# Altium footprint library Tomra_Cadstar_Footprints.PcbLib: 373 footprints (part 17 of 24)
Each footprint in its own frame and in the unit in brackets; x right, y up, seen from the top. Pads: shape width x height; smd on the part's side, far side on the other; paste and mask are expansions set on the pad; w line width, h text height; cw(c..) or ccw(c..) is an arc to the next point about the centre after c.
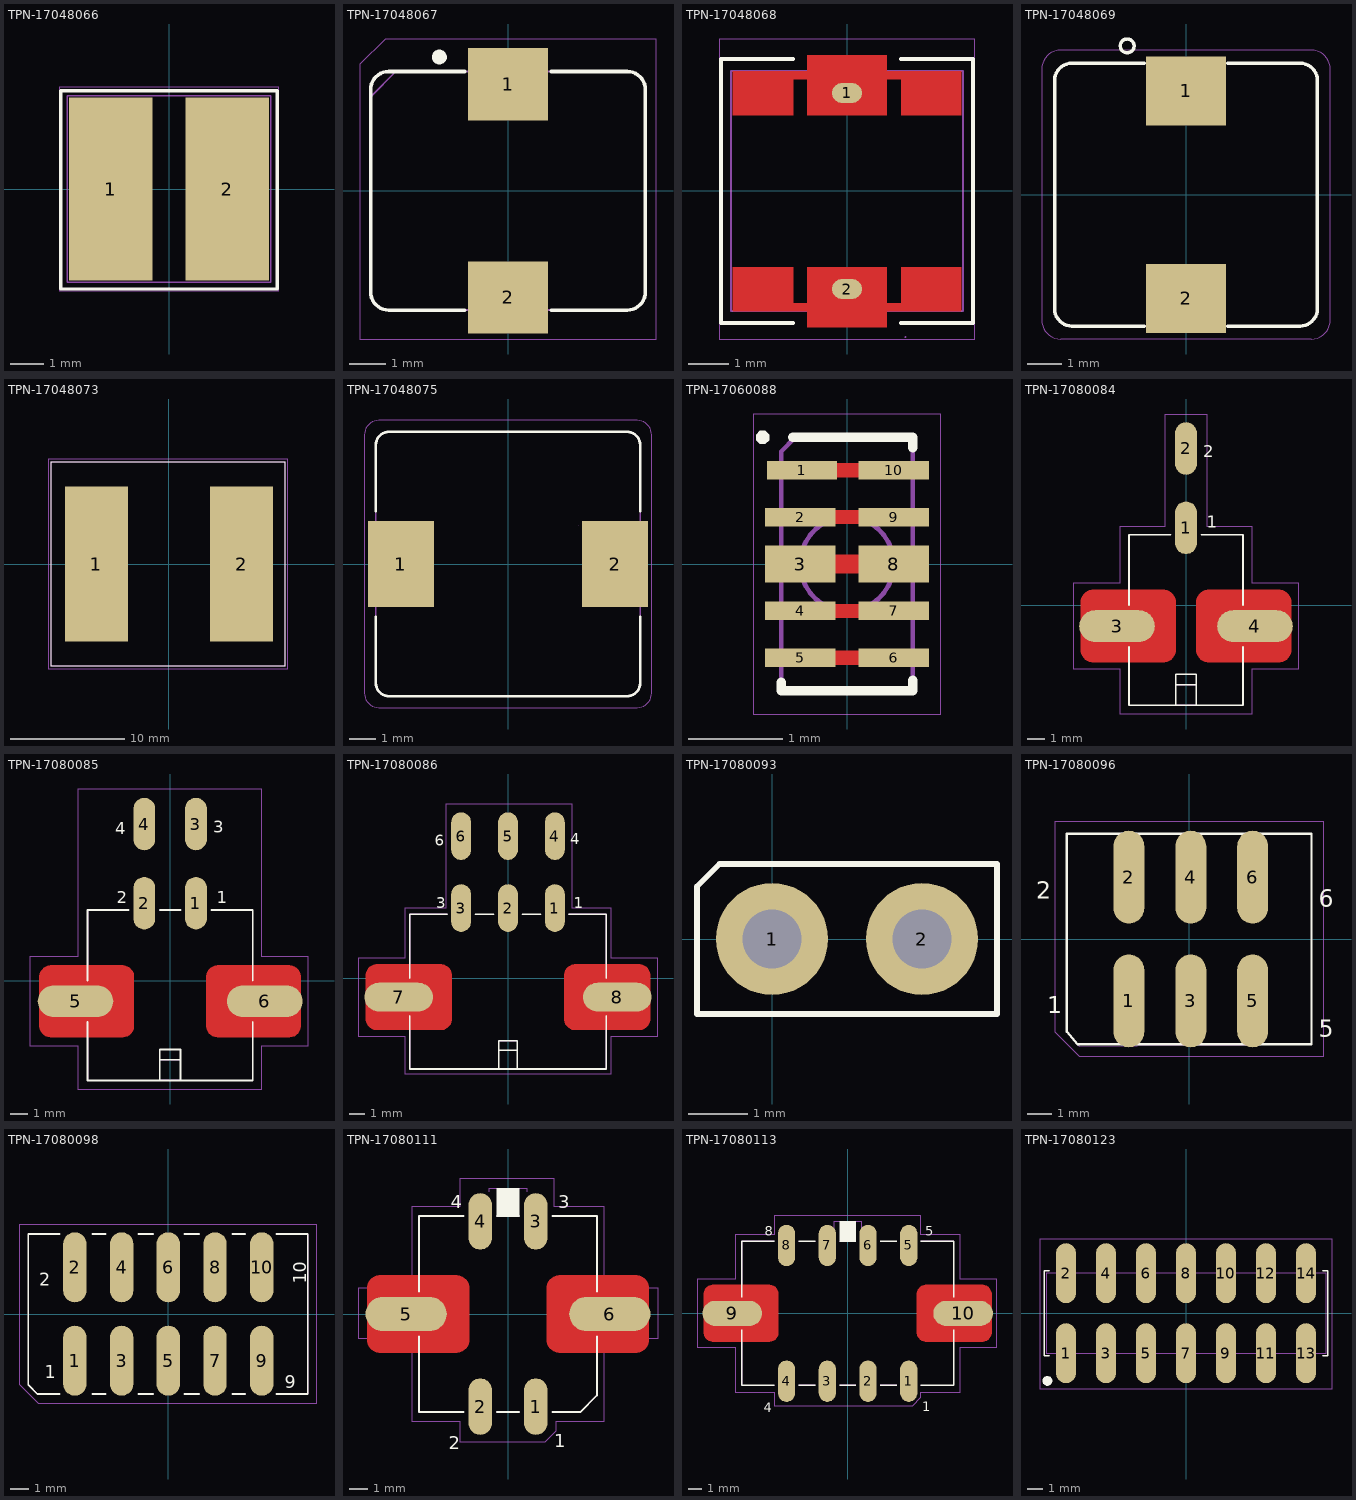
[diagram p16: the footprints below, top view; thin cyan lines are the x and y axes]

## TPN-17048066 [mm]
height 2
pads (2):
  rrect0% 2.5x5.5 smd paste+0 mask+0: 1(-1.75,0) 2(1.75,0)
Top Silk:
  lines w0.1: -3.25,-3 3.25,-3 3.25,2.95 -3.25,2.95 -3.25,-3
  text ".Designator" at -3.599,-0.35 h0.7
Top Assembly:
  lines w0.05: -3.05,-2.8 3.05,-2.8 3.05,2.8 -3.05,2.8 -3.05,-2.8
Top Placement:
  lines w0.01: -3.3,-3.05 3.3,-3.05 3.3,3.05 -3.3,3.05 -3.3,-3.05

## TPN-17048067 [mm]
height 5.8
pads (2):
  rrect0% 2.2x2 smd paste+0 mask+0: 1(0,2.95) 2(0,-2.95)
Top Silk:
  region: -1.9,3.5 -1.94,3.5 -2.013,3.53 -2.07,3.587 -2.1,3.66 -2.1,3.74 -2.07,3.813 -2.013,3.87 -1.94,3.9 -1.9,3.9 -1.86,3.9 -1.787,3.87 -1.73,3.813 -1.7,3.74 -1.7,3.66 -1.73,3.587 -1.787,3.53 -1.86,3.5
  lines w0.1: -1.2,-3.3 -3.3,-3.3 cw(c-3.3,-2.8) -3.8,-2.8 -3.8,2.8 cw(c-3.3,2.8) -3.3,3.3 -1.2,3.3 ; 1.2,-3.3 3.3,-3.3 ccw(c3.3,-2.8) 3.8,-2.8 3.8,2.8 ccw(c3.3,2.8) 3.3,3.3 1.2,3.3
Top Assembly:
  lines w0.05: -3.8,-2.8 ccw(c-3.3,-2.8) -3.3,-3.3 3.3,-3.3 ccw(c3.3,-2.8) 3.8,-2.8 3.8,2.8 ccw(c3.3,2.8) 3.3,3.3 -3.1,3.3 -3.8,2.6 -3.8,-2.8
Top Placement:
  lines w0.01: -4.1,-4.1 4.1,-4.1 4.1,4.2 -3.4,4.2 -4.1,3.5 -4.1,-4.1

## TPN-17048068 [mm]
height 4.5
pads (2):
  oval 0.754x0.5 smd paste+0 mask+0: 1(0,2.45) 2(0,-2.45)
Top Elec:
  region: -2.85,1.9 -1.35,1.9 -1.35,2.8 -1,2.8 -1,1.9 1,1.9 1,2.8 1.35,2.8 1.35,1.9 2.85,1.9 2.85,3 1,3 1,3.4 -1,3.4 -1,3 -2.85,3
  region: 2.85,-1.9 1.35,-1.9 1.35,-2.8 1,-2.8 1,-1.9 -1,-1.9 -1,-2.8 -1.35,-2.8 -1.35,-1.9 -2.85,-1.9 -2.85,-3 -1,-3 -1,-3.4 1,-3.4 1,-3 2.85,-3
  region: -2.85,1.9 -1.35,1.9 -1.35,2.8 -1,2.8 -1,1.9 1,1.9 1,2.8 1.35,2.8 1.35,1.9 2.85,1.9 2.85,3 1,3 1,3.4 -1,3.4 -1,3 -2.85,3
Top Silk:
  lines w0.1: -1.35,-3.3 -3.15,-3.3 -3.15,3.3 -1.35,3.3 ; 1.35,-3.3 3.15,-3.3 3.15,3.3 1.35,3.3
Top Paste:
  region: -1,1.9 1,1.9 1,3.4 -1,3.4
  region: -1,-3.4 1,-3.4 1,-1.9 -1,-1.9
  region: -2.85,1.9 -1.5,1.9 -1.5,3 -2.85,3
  region: 1.5,-3 2.85,-3 2.85,-1.9 1.5,-1.9
  region: 1.5,1.9 2.85,1.9 2.85,3 1.5,3
  region: -2.85,-3 -1.5,-3 -1.5,-1.9 -2.85,-1.9
Top Solder Resist:
  region: 2.85,-1.9 -2.85,-1.9 -2.85,-3 -1,-3 -1,-3.4 1,-3.4 1,-3 2.85,-3
  region: -2.85,1.9 2.85,1.9 2.85,3 1,3 1,3.4 -1,3.4 -1,3 -2.85,3
Top Assembly:
  lines w0.05: -2.9,-3 2.9,-3 2.9,3 -2.9,3 -2.9,-3
  text ".Designator" at -1.799,-0.175 h0.35
Top Placement:
  lines w0.01: -3.2,-3.7 3.2,-3.7 3.2,3.8 -3.2,3.8 -3.2,-3.7
  lines w0.05: 1.462,-3.653 1.463,-3.655 1.464,-3.655 1.464,-3.654 1.463,-3.654 1.462,-3.653

## TPN-17048069 [mm]
height 5.5
pads (2):
  rrect0% 2.3x2 smd paste+0 mask+0: 1(0,3) 2(0,-3)
Top Silk:
  lines w0.1: -1.2,-3.8 -3.3,-3.8 cw(c-3.3,-3.3) -3.8,-3.3 -3.8,3.3 cw(c-3.3,3.3) -3.3,3.8 -1.2,3.8 ; 1.2,-3.8 3.3,-3.8 ccw(c3.3,-3.3) 3.8,-3.3 3.8,3.3 ccw(c3.3,3.3) 3.3,3.8 1.2,3.8 ; -1.7,4.1 cw(c-1.7,4.3) -1.7,4.5 cw(c-1.7,4.3) -1.7,4.1
  text ".Designator" at -3.599,-0.35 h0.7
Top Assembly:
  lines w0.05: -3.8,-3.3 ccw(c-3.3,-3.3) -3.3,-3.8 3.3,-3.8 ccw(c3.3,-3.3) 3.8,-3.3 3.8,3.3 ccw(c3.3,3.3) 3.3,3.8 -3.3,3.8 ccw(c-3.3,3.3) -3.8,3.3 -3.8,-3.3
Top Placement:
  lines w0.01: -4.175,-3.626 ccw(c-3.626,-3.626) -3.626,-4.175 3.626,-4.175 ccw(c3.626,-3.626) 4.175,-3.626 4.175,3.626 ccw(c3.626,3.626) 3.626,4.175 -3.626,4.175 ccw(c-3.626,3.626) -4.175,3.626 -4.175,-3.626

## TPN-17048073 [mm]
height 10
pads (2):
  rect 5.5x13.5 smd paste+0 mask+0: 1(-6.326,0) 2(6.374,0)
Top Silk:
  lines w0.1: -10.287,-8.89 10.16,-8.89 10.16,8.89 -10.287,8.89 -10.287,-8.89
Top Assembly:
  lines w0.05: -10.287,-8.89 10.16,-8.89 10.16,8.89 -10.287,8.89 -10.287,-8.89
Top Placement:
  lines w0.01: -10.537,-9.14 10.41,-9.14 10.41,9.14 -10.537,9.14 -10.537,-9.14
  text ".Designator" at -3.575,-0.35 h0.7

## TPN-17048075 [mm]
height 4.5
pads (2):
  rrect0% 2.5x3.25 smd paste+0 mask+0: 1(-4.05,0) 2(4.05,0)
Top Silk:
  lines w0.1: -5,-2 -5,-4.5 ccw(c-4.5,-4.5) -4.5,-5 4.5,-5 ccw(c4.5,-4.5) 5,-4.5 5,-2 ; -5,2 -5,4.5 cw(c-4.5,4.5) -4.5,5 4.5,5 cw(c4.5,4.5) 5,4.5 5,2
  text ".Designator" at 0.35,-3.599 h0.7
Top Assembly:
  lines w0.05: -5,-4.5 -5,4.5 cw(c-4.5,4.5) -4.5,5 4.5,5 cw(c4.5,4.5) 5,4.5 5,-4.5 cw(c4.5,-4.5) 4.5,-5 -4.5,-5 cw(c-4.5,-4.5) -5,-4.5
Top Placement:
  lines w0.01: -5.432,-4.889 -5.432,4.889 cw(c-4.889,4.889) -4.889,5.432 4.889,5.432 cw(c4.889,4.889) 5.432,4.889 5.432,-4.889 cw(c4.889,-4.889) 4.889,-5.432 -4.889,-5.432 cw(c-4.889,-4.889) -5.432,-4.889
  lines w0.05: 2.653,1.462 2.655,1.463 2.655,1.464 2.654,1.464 2.654,1.463 2.653,1.462

## TPN-17060088 [mm]
height 0.65
pads (10):
  rrect0% 0.75x0.2 smd paste+0 mask+0: 1(-0.48,1) 2(-0.5,0.5) 4(-0.5,-0.5) 5(-0.5,-1) 6(0.5,-1) 7(0.5,-0.5) 9(0.5,0.5) 10(0.5,1)
  rrect0% 0.75x0.4 smd paste+0 mask+0: 3(-0.5,0) 8(0.5,0)
Top Elec:
  lines w0.15: -0.61,-1 0.61,-1 ; -0.61,-0.5 0.61,-0.5 ; -0.61,0.5 0.61,0.5 ; -0.61,1 0.61,1
  lines w0.2: -0.61,0 0.61,0
Top Silk:
  region: -0.9,1.28 -0.929,1.28 -0.97,1.321 -0.97,1.379 -0.929,1.42 -0.9,1.42 -0.871,1.42 -0.83,1.379 -0.83,1.321 -0.871,1.28
  lines w0.1: -0.7,-1.26 -0.7,-1.35 0.7,-1.35 0.7,-1.24 ; -0.58,1.35 0.7,1.35 0.7,1.24
  text ".Designator" at -0.58,1.35 h0.35
Drill:
  lines w0.05: -0.5,0 cw(c0,0) 0.5,0 cw(c0,0) -0.5,0
Top Assembly:
  lines w0.05: -0.7,-1.35 0.7,-1.35 0.7,1.35 -0.55,1.35 -0.7,1.2 -0.7,-1.35
Top Placement:
  lines w0.01: -1,-1.6 1,-1.6 1,1.6 -1,1.6 -1,-1.6

## TPN-17080084 [mm]
height 8
pads (4):
  oval 1.27x3.048 smd paste+0 mask+0: 1(0,4.5) 2(0,9.1)
  oval 4.39x1.85 smd paste+0 mask+0: 3(-4,-1.2) 4(4,-1.2)
Top Elec:
  region: -6.1,0.2 -6.1,0.269 -6.073,0.404 -6.02,0.532 -5.944,0.646 -5.846,0.744 -5.732,0.82 -5.604,0.873 -5.469,0.9 -5.4,0.9 -1.3,0.9 -1.231,0.9 -1.096,0.873 -0.968,0.82 -0.854,0.744 -0.756,0.646 -0.68,0.532 -0.627,0.404 -0.6,0.269 -0.6,0.2 -0.6,-2.6 -0.6,-2.669 -0.627,-2.804 -0.68,-2.932 -0.756,-3.046 -0.854,-3.144 -0.968,-3.22 -1.096,-3.273 -1.231,-3.3 -1.3,-3.3 -5.4,-3.3 -5.469,-3.3 -5.604,-3.273 -5.732,-3.22 -5.846,-3.144 -5.944,-3.046 -6.02,-2.932 -6.073,-2.804 -6.1,-2.669 -6.1,-2.6
  region: 0.6,0.2 0.6,0.269 0.627,0.404 0.68,0.532 0.756,0.646 0.854,0.744 0.968,0.82 1.096,0.873 1.231,0.9 1.3,0.9 5.4,0.9 5.469,0.9 5.604,0.873 5.732,0.82 5.846,0.744 5.944,0.646 6.02,0.532 6.073,0.404 6.1,0.269 6.1,0.2 6.1,-2.6 6.1,-2.669 6.073,-2.804 6.02,-2.932 5.944,-3.046 5.846,-3.144 5.732,-3.22 5.604,-3.273 5.469,-3.3 5.4,-3.3 1.3,-3.3 1.231,-3.3 1.096,-3.273 0.968,-3.22 0.854,-3.144 0.756,-3.046 0.68,-2.932 0.627,-2.804 0.6,-2.669 0.6,-2.6
Top Silk:
  lines w0.1: -3.3,-2.4 -3.3,-5.8 3.3,-5.8 3.3,-2.4 ; -3.3,0 -3.3,4.1 -0.9,4.1 ; -0.6,-4.6 0.6,-4.6 ; 0.9,4.1 3.3,4.1 3.3,0 ; -0.6,-5.8 0.6,-5.8 0.6,-4 -0.6,-4 -0.6,-5.8
  text "1" at 1.2,4.5 h0.7
  text "2" at 1,8.6 h0.7
  text ".Designator" at 0,0 h0.7
Top Assembly:
  lines w0.05: -3.3,-2.4 -3.3,-5.8 3.3,-5.8 3.3,-2.4 ; -3.3,0 -3.3,4.1 -0.9,4.1 ; -0.6,-4.6 0.6,-4.6 ; 0.9,4.1 3.3,4.1 3.3,0 ; -0.6,-5.8 0.6,-5.8 0.6,-4 -0.6,-4 -0.6,-5.8
  text "2" at 1,8.6 h0.7
  text "1" at 1.2,4.5 h0.7
Top Placement:
  lines w0.01: -6.5,-3.7 -3.8,-3.7 -3.8,-6.3 3.8,-6.3 3.8,-3.7 6.5,-3.7 6.5,1.3 3.8,1.3 3.8,4.6 1.2,4.6 1.2,11.1 -1.2,11.1 -1.2,4.6 -3.8,4.6 -3.8,1.3 -6.5,1.3 -6.5,-3.7
  text "2" at 1,8.6 h0.7
  text "1" at 1.2,4.5 h0.7

## TPN-17080085 [mm]
height 8
pads (6):
  oval 1.27x3.048 smd paste+0 mask+0: 1(1.5,4.5) 2(-1.5,4.5) 3(1.5,9.1) 4(-1.5,9.1)
  oval 4.39x1.85 smd paste+0 mask+0: 5(-5.5,-1.2) 6(5.5,-1.2)
Top Elec:
  region: -7.6,0.2 -7.6,0.269 -7.573,0.404 -7.52,0.532 -7.444,0.646 -7.346,0.744 -7.232,0.82 -7.104,0.873 -6.969,0.9 -6.9,0.9 -2.8,0.9 -2.731,0.9 -2.596,0.873 -2.468,0.82 -2.354,0.744 -2.256,0.646 -2.18,0.532 -2.127,0.404 -2.1,0.269 -2.1,0.2 -2.1,-2.6 -2.1,-2.669 -2.127,-2.804 -2.18,-2.932 -2.256,-3.046 -2.354,-3.144 -2.468,-3.22 -2.596,-3.273 -2.731,-3.3 -2.8,-3.3 -6.9,-3.3 -6.969,-3.3 -7.104,-3.273 -7.232,-3.22 -7.346,-3.144 -7.444,-3.046 -7.52,-2.932 -7.573,-2.804 -7.6,-2.669 -7.6,-2.6
  region: 2.1,0.2 2.1,0.269 2.127,0.404 2.18,0.532 2.256,0.646 2.354,0.744 2.468,0.82 2.596,0.873 2.731,0.9 2.8,0.9 6.9,0.9 6.969,0.9 7.104,0.873 7.232,0.82 7.346,0.744 7.444,0.646 7.52,0.532 7.573,0.404 7.6,0.269 7.6,0.2 7.6,-2.6 7.6,-2.669 7.573,-2.804 7.52,-2.932 7.444,-3.046 7.346,-3.144 7.232,-3.22 7.104,-3.273 6.969,-3.3 6.9,-3.3 2.8,-3.3 2.731,-3.3 2.596,-3.273 2.468,-3.22 2.354,-3.144 2.256,-3.046 2.18,-2.932 2.127,-2.804 2.1,-2.669 2.1,-2.6
Top Silk:
  lines w0.1: -4.8,-2.4 -4.8,-5.8 4.8,-5.8 4.8,-2.4 ; -4.8,0 -4.8,4.1 -2.4,4.1 ; -0.6,-4.6 0.6,-4.6 ; -0.6,4.1 0.6,4.1 ; 2.4,4.1 4.8,4.1 4.8,0 ; -0.6,-5.8 0.6,-5.8 0.6,-4 -0.6,-4 -0.6,-5.8
  text "4" at -3.2,8.5 h0.7
  text "1" at 2.7,4.5 h0.7
  text "2" at -3.1,4.5 h0.7
  text "3" at 2.5,8.6 h0.7
  text ".Designator" at 0,0 h0.7
Top Assembly:
  lines w0.05: -4.8,-2.4 -4.8,-5.8 4.8,-5.8 4.8,-2.4 ; -4.8,0 -4.8,4.1 -2.4,4.1 ; -0.6,-4.6 0.6,-4.6 ; -0.6,4.1 0.6,4.1 ; 2.4,4.1 4.8,4.1 4.8,0 ; -0.6,-5.8 0.6,-5.8 0.6,-4 -0.6,-4 -0.6,-5.8
  text "1" at 2.7,4.5 h0.7
  text "4" at -3.2,8.5 h0.7
  text "2" at -3.1,4.5 h0.7
  text "3" at 2.5,8.6 h0.7
Top Placement:
  lines w0.01: -0.6,-4.6 0.6,-4.6 ; -8.165,-3.8 -8.165,1.4 -5.365,1.4 -5.365,11.14 5.33,11.14 5.33,1.4 8.035,1.4 8.035,-3.8 5.335,-3.8 5.33,-6.3 -5.365,-6.3 -5.365,-3.8 -8.165,-3.8 ; -0.6,-5.8 0.6,-5.8 0.6,-4 -0.6,-4 -0.6,-5.8
  text "4" at -3.2,8.5 h0.7
  text "4" at -3.2,8.5 h0.7
  text "1" at 2.7,4.5 h0.7
  text "1" at 2.7,4.5 h0.7
  text "2" at -3.1,4.5 h0.7
  text "2" at -3.1,4.5 h0.7
  text "3" at 2.5,8.6 h0.7
  text "3" at 2.5,8.6 h0.7

## TPN-17080086 [mm]
height 8
pads (8):
  oval 1.27x3.048 smd paste+0 mask+0: 1(3,4.5) 2(0,4.5) 3(-3,4.5) 4(3,9.1) 5(0,9.1) 6(-3,9.1)
  oval 4.39x1.85 smd paste+0 mask+0: 7(-7,-1.2) 8(7,-1.2)
Top Elec:
  region: -9.1,0.2 -9.1,0.269 -9.073,0.404 -9.02,0.532 -8.944,0.646 -8.846,0.744 -8.732,0.82 -8.604,0.873 -8.469,0.9 -8.4,0.9 -4.3,0.9 -4.231,0.9 -4.096,0.873 -3.968,0.82 -3.854,0.744 -3.756,0.646 -3.68,0.532 -3.627,0.404 -3.6,0.269 -3.6,0.2 -3.6,-2.6 -3.6,-2.669 -3.627,-2.804 -3.68,-2.932 -3.756,-3.046 -3.854,-3.144 -3.968,-3.22 -4.096,-3.273 -4.231,-3.3 -4.3,-3.3 -8.4,-3.3 -8.469,-3.3 -8.604,-3.273 -8.732,-3.22 -8.846,-3.144 -8.944,-3.046 -9.02,-2.932 -9.073,-2.804 -9.1,-2.669 -9.1,-2.6
  region: 3.6,0.2 3.6,0.269 3.627,0.404 3.68,0.532 3.756,0.646 3.854,0.744 3.968,0.82 4.096,0.873 4.231,0.9 4.3,0.9 8.4,0.9 8.469,0.9 8.604,0.873 8.732,0.82 8.846,0.744 8.944,0.646 9.02,0.532 9.073,0.404 9.1,0.269 9.1,0.2 9.1,-2.6 9.1,-2.669 9.073,-2.804 9.02,-2.932 8.944,-3.046 8.846,-3.144 8.732,-3.22 8.604,-3.273 8.469,-3.3 8.4,-3.3 4.3,-3.3 4.231,-3.3 4.096,-3.273 3.968,-3.22 3.854,-3.144 3.756,-3.046 3.68,-2.932 3.627,-2.804 3.6,-2.669 3.6,-2.6
Top Silk:
  lines w0.1: -6.3,-2.4 -6.3,-5.8 6.3,-5.8 6.3,-2.4 ; -6.3,0 -6.3,4.1 -3.9,4.1 ; -2.1,4.1 -0.9,4.1 ; -0.6,-4.6 0.6,-4.6 ; 0.9,4.1 2.1,4.1 ; 3.9,4.1 6.3,4.1 6.3,0 ; -0.6,-5.8 0.6,-5.8 0.6,-4 -0.6,-4 -0.6,-5.8
  text "1" at 4.2,4.5 h0.7
  text "6" at -4.7,8.5 h0.7
  text "3" at -4.6,4.5 h0.7
  text "4" at 4,8.6 h0.7
  text ".Designator" at 0,0 h0.7
Top Assembly:
  lines w0.05: -6.3,-2.4 -6.3,-5.8 6.3,-5.8 6.3,-2.4 ; -6.3,0 -6.3,4.1 -3.9,4.1 ; -2.1,4.1 -0.9,4.1 ; -0.6,-4.6 0.6,-4.6 ; 0.9,4.1 2.1,4.1 ; 3.9,4.1 6.3,4.1 6.3,0 ; -0.6,-5.8 0.6,-5.8 0.6,-4 -0.6,-4 -0.6,-5.8
  text "1" at 4.2,4.5 h0.7
  text "6" at -4.7,8.5 h0.7
  text "3" at -4.6,4.5 h0.7
  text "4" at 4,8.6 h0.7
Top Placement:
  lines w0.01: -9.6,-3.7 -9.6,1.3 -6.6,1.3 -6.6,4.5 -4,4.5 -4,11.14 4.1,11.14 4.1,4.5 6.6,4.5 6.6,1.3 9.6,1.3 9.6,-3.7 6.6,-3.7 6.6,-6.1 -6.6,-6.1 -6.6,-3.7 -9.6,-3.7
  text "1" at 4.2,4.5 h0.7
  text "6" at -4.7,8.5 h0.7
  text "3" at -4.6,4.5 h0.7
  text "4" at 4,8.6 h0.7

## TPN-17080093 [mm]
height 9
pads (2):
  round 1.9 / inner round 1.524 / far side round 1.9 hole 1 paste+0.25 mask+0: 1(0,0) 2(2.54,0)
Top Silk:
  lines w0.1: -1.27,-1.27 -1.27,0.889 -0.889,1.27 3.81,1.27 3.81,-1.27 -1.27,-1.27
  text ".Designator" at -1.24,1.46 h0.7
Top Assembly:
  lines w0.05: -1.27,-1.27 -1.27,0.889 -0.889,1.27 3.81,1.27 3.81,-1.27 -1.27,-1.27
Top Placement:
  lines w0.01: -1.27,-1.27 -1.27,0.889 -0.889,1.27 3.81,1.27 3.81,-1.27 -1.27,-1.27

## TPN-17080096 [mil]
height 472.44
pads (6):
  oval 50x150 smd paste+0 mask+0: 1(-97.5,-100) 2(-97.5,100) 3(2.5,-100) 4(2.5,100) 5(102.5,-100) 6(102.5,100)
Top Silk:
  lines w3.94: -197.5,-150 -197.5,170 197.5,170 197.5,-170 -180.5,-170 -197.5,-150
  text "2" at -247.5,65 h27.56
  text "1" at -229.5,-120 h27.56
  text "6" at 209.5,52 h27.56
  text "5" at 209.5,-158 h27.56
  text ".Designator" at 0,0 h27.56
Top Assembly:
  lines w1.97: -197.5,-150 -197.5,170 197.5,170 197.5,-170 -177.5,-173 -197.5,-150
Top Placement:
  lines w0.39: -217.19,-150 -177.5,-189.69 217.19,-189.69 217.19,189.69 -217.19,189.69 -217.19,-150

## TPN-17080098 [mm]
height 12
pads (10):
  oval 1.27x3.81 smd paste+0 mask+0: 1(-5.08,-2.54) 2(-5.08,2.54) 3(-2.54,-2.54) 4(-2.54,2.54) 5(0,-2.54) 6(0,2.54) 7(2.54,-2.54) 8(2.54,2.54) 9(5.08,-2.54) 10(5.08,2.54)
Top Silk:
  lines w0.1: -5.92,-4.35 -7.12,-4.35 -7.62,-3.85 -7.62,4.35 -5.92,4.35 ; -4.12,-4.35 -3.42,-4.35 ; -4.12,4.35 -3.42,4.35 ; -1.62,-4.35 -0.82,-4.35 ; -1.62,4.35 -0.82,4.35 ; 0.88,-4.35 1.68,-4.35 ; 0.88,4.35 1.68,4.35 ; 3.48,-4.35 4.18,-4.35 ; 3.48,4.35 4.18,4.35 ; 5.88,-4.35 7.58,-4.35 7.58,4.35 5.88,4.35
  text "1" at -6.731,-3.505 h0.7
  text "2" at -7.01,1.549 h0.7
  text "10" at 7.493,1.651 h0.7
  text "9" at 6.325,-4.039 h0.7
  text ".Designator" at 0,0 h0.7
Top Assembly:
  lines w0.05: -5.92,-4.35 -7.12,-4.35 -7.62,-3.85 -7.62,4.35 -5.92,4.35 ; -4.12,-4.35 -3.42,-4.35 ; -4.12,4.35 -3.42,4.35 ; -1.62,-4.35 -0.82,-4.35 ; -1.62,4.35 -0.82,4.35 ; 0.88,-4.35 1.68,-4.35 ; 0.88,4.35 1.68,4.35 ; 3.48,-4.35 4.18,-4.35 ; 3.48,4.35 4.18,4.35 ; 5.88,-4.35 7.58,-4.35 7.58,4.35 5.88,4.35
  text "1" at -6.731,-3.505 h0.7
  text "2" at -7.01,1.549 h0.7
  text "10" at 7.493,1.651 h0.7
  text "9" at 6.325,-4.039 h0.7
Top Placement:
  lines w0.01: -8.12,-3.81 -7.08,-4.85 8.08,-4.85 8.08,4.85 -8.12,4.85 -8.12,-3.81

## TPN-17080111 [mm]
pads (6):
  oval 1.27x3.048 smd paste+0 mask+0: 1(1.5,-5) 2(-1.5,-5) 3(1.5,5) 4(-1.5,5)
  oval 4.39x1.85 smd paste+0 mask+0: 5(-5.5,0) 6(5.5,0)
Top Elec:
  region: -7.6,1.4 -7.6,1.469 -7.573,1.604 -7.52,1.732 -7.444,1.846 -7.346,1.944 -7.232,2.02 -7.104,2.073 -6.969,2.1 -6.9,2.1 -2.8,2.1 -2.731,2.1 -2.596,2.073 -2.468,2.02 -2.354,1.944 -2.256,1.846 -2.18,1.732 -2.127,1.604 -2.1,1.469 -2.1,1.4 -2.1,-1.4 -2.1,-1.469 -2.127,-1.604 -2.18,-1.732 -2.256,-1.846 -2.354,-1.944 -2.468,-2.02 -2.596,-2.073 -2.731,-2.1 -2.8,-2.1 -6.9,-2.1 -6.969,-2.1 -7.104,-2.073 -7.232,-2.02 -7.346,-1.944 -7.444,-1.846 -7.52,-1.732 -7.573,-1.604 -7.6,-1.469 -7.6,-1.4
  region: 2.1,1.4 2.1,1.469 2.127,1.604 2.18,1.732 2.256,1.846 2.354,1.944 2.468,2.02 2.596,2.073 2.731,2.1 2.8,2.1 6.9,2.1 6.969,2.1 7.104,2.073 7.232,2.02 7.346,1.944 7.444,1.846 7.52,1.732 7.573,1.604 7.6,1.469 7.6,1.4 7.6,-1.4 7.6,-1.469 7.573,-1.604 7.52,-1.732 7.444,-1.846 7.346,-1.944 7.232,-2.02 7.104,-2.073 6.969,-2.1 6.9,-2.1 2.8,-2.1 2.731,-2.1 2.596,-2.073 2.468,-2.02 2.354,-1.944 2.256,-1.846 2.18,-1.732 2.127,-1.604 2.1,-1.469 2.1,-1.4
Top Silk:
  region: -0.6,5.3 0.6,5.3 0.6,6.8 -0.6,6.8
  lines w0.1: -4.8,-1.2 -4.8,-5.3 -2.4,-5.3 ; -4.8,1.2 -4.8,5.3 -2.4,5.3 ; -0.6,-5.3 0.6,-5.3 ; -0.6,5.3 0.6,5.3 ; 2.4,-5.3 3.9,-5.3 4.8,-4.4 4.8,-1.2 ; 2.4,5.3 4.8,5.3 4.8,1.2
  text "1" at 2.5,-7.2 h0.7
  text "3" at 2.7,5.7 h0.7
  text "4" at -3.1,5.7 h0.7
  text "2" at -3.2,-7.3 h0.7
  text ".Designator" at -1,6.8 h0.7
Top Assembly:
  lines w0.05: -4.8,-1.2 -4.8,-5.3 -2.4,-5.3 ; -4.8,1.2 -4.8,5.3 -2.4,5.3 ; -1,6.6 -1,6.8 1,6.8 1,6.6 ; -0.6,-5.3 0.6,-5.3 ; -0.6,5.3 0.6,5.3 ; 2.4,-5.3 3.9,-5.3 4.8,-4.4 4.8,-1.2 ; 2.4,5.3 4.8,5.3 4.8,1.2
  text "1" at 2.5,-7.2 h0.7
  text "3" at 2.7,5.7 h0.7
  text "4" at -3.1,5.7 h0.7
  text "2" at -3.2,-7.3 h0.7
Top Placement:
  lines w0.01: -8.1,-1.3 -8.1,1.4 -5.2,1.4 -5.2,5.8 -2.6,5.8 -2.6,7.3 2.5,7.3 2.5,5.8 5.2,5.8 5.2,1.4 8.1,1.4 8.1,-1.3 5.2,-1.3 5.2,-5.8 2.6,-5.8 2.6,-6.3 2,-6.9 -2.6,-6.9 -2.6,-5.8 -5.2,-5.8 -5.2,-1.3 -8.1,-1.3
  text "1" at 2.5,-7.2 h0.7
  text "3" at 2.7,5.7 h0.7
  text "4" at -3.1,5.7 h0.7
  text "2" at -3.2,-7.3 h0.7

## TPN-17080113 [mm]
pads (10):
  oval 1.27x3.048 smd paste+0 mask+0: 1(4.5,-5) 2(1.5,-5) 3(-1.5,-5) 4(-4.5,-5) 5(4.5,5) 6(1.5,5) 7(-1.5,5) 8(-4.5,5)
  oval 4.39x1.85 smd paste+0 mask+0: 9(-8.5,0) 10(8.5,0)
Top Elec:
  region: -10.6,1.4 -10.6,1.469 -10.573,1.604 -10.52,1.732 -10.444,1.846 -10.346,1.944 -10.232,2.02 -10.104,2.073 -9.969,2.1 -9.9,2.1 -5.8,2.1 -5.731,2.1 -5.596,2.073 -5.468,2.02 -5.354,1.944 -5.256,1.846 -5.18,1.732 -5.127,1.604 -5.1,1.469 -5.1,1.4 -5.1,-1.4 -5.1,-1.469 -5.127,-1.604 -5.18,-1.732 -5.256,-1.846 -5.354,-1.944 -5.468,-2.02 -5.596,-2.073 -5.731,-2.1 -5.8,-2.1 -9.9,-2.1 -9.969,-2.1 -10.104,-2.073 -10.232,-2.02 -10.346,-1.944 -10.444,-1.846 -10.52,-1.732 -10.573,-1.604 -10.6,-1.469 -10.6,-1.4
  region: 5.1,1.4 5.1,1.469 5.127,1.604 5.18,1.732 5.256,1.846 5.354,1.944 5.468,2.02 5.596,2.073 5.731,2.1 5.8,2.1 9.9,2.1 9.969,2.1 10.104,2.073 10.232,2.02 10.346,1.944 10.444,1.846 10.52,1.732 10.573,1.604 10.6,1.469 10.6,1.4 10.6,-1.4 10.6,-1.469 10.573,-1.604 10.52,-1.732 10.444,-1.846 10.346,-1.944 10.232,-2.02 10.104,-2.073 9.969,-2.1 9.9,-2.1 5.8,-2.1 5.731,-2.1 5.596,-2.073 5.468,-2.02 5.354,-1.944 5.256,-1.846 5.18,-1.732 5.127,-1.604 5.1,-1.469 5.1,-1.4
Top Silk:
  region: -0.6,5.3 0.6,5.3 0.6,6.8 -0.6,6.8
  lines w0.1: -7.8,-1.2 -7.8,-5.3 -5.4,-5.3 ; -7.8,1.2 -7.8,5.3 -5.4,5.3 ; -3.6,-5.3 -2.4,-5.3 ; -3.6,5.3 -2.4,5.3 ; -0.6,-5.3 0.6,-5.3 ; -0.6,5.3 0.6,5.3 ; 2.4,-5.3 3.6,-5.3 ; 2.4,5.3 3.6,5.3 ; 5.4,-5.3 7.8,-5.3 7.8,-1.2 ; 5.4,5.3 7.8,5.3 7.8,1.2
  text "1" at 5.5,-7.2 h0.7
  text "4" at -6.2,-7.3 h0.7
  text "5" at 5.7,5.7 h0.7
  text "8" at -6.1,5.7 h0.7
  text ".Designator" at -1,6.8 h0.7
Top Assembly:
  lines w0.05: -7.8,-1.2 -7.8,-5.3 -5.4,-5.3 ; -7.8,1.2 -7.8,5.3 -5.4,5.3 ; -3.6,-5.3 -2.4,-5.3 ; -3.6,5.3 -2.4,5.3 ; -1,5.3 -1,6.8 1,6.8 1,5.3 ; -0.6,-5.3 0.6,-5.3 ; -0.6,5.3 0.6,5.3 ; 2.4,-5.3 3.6,-5.3 ; 2.4,5.3 3.6,5.3 ; 5.4,-5.3 7.8,-5.3 7.8,-1.2 ; 5.4,5.3 7.8,5.3 7.8,1.2
  text "1" at 5.5,-7.2 h0.7
  text "4" at -6.2,-7.3 h0.7
  text "5" at 5.7,5.7 h0.7
  text "8" at -6.1,5.7 h0.7
Top Placement:
  lines w0.01: -11.1,-2.5 -11.1,2.5 -8.3,2.5 -8.3,5.8 -5.4,5.8 -5.4,7.2 5.4,7.2 5.4,5.8 8.3,5.8 8.3,2.5 11,2.5 11,-2.5 8.3,-2.5 8.3,-5.8 5.4,-5.8 5.4,-6.2 4.8,-6.8 -5.4,-6.8 -5.4,-5.8 -8.3,-5.8 -8.3,-2.5 -11.1,-2.5
  text "1" at 5.5,-7.2 h0.7
  text "4" at -6.2,-7.3 h0.7
  text "5" at 5.7,5.7 h0.7
  text "8" at -6.1,5.7 h0.7

## TPN-17080123 [mm]
height 12
pads (14):
  oval 1.27x3.81 smd paste+0 mask+0: 1(-7.62,-2.54) 2(-7.62,2.54) 3(-5.08,-2.54) 4(-5.08,2.54) 5(-2.54,-2.54) 6(-2.54,2.54) 7(0,-2.54) 8(0,2.54) 9(2.54,-2.54) 10(2.54,2.54) 11(5.08,-2.54) 12(5.08,2.54) 13(7.62,-2.54) 14(7.62,2.54)
Top Silk:
  region: -8.8,-4.6 -8.86,-4.6 -8.97,-4.554 -9.054,-4.47 -9.1,-4.36 -9.1,-4.24 -9.054,-4.13 -8.97,-4.046 -8.86,-4 -8.8,-4 -8.74,-4 -8.63,-4.046 -8.546,-4.13 -8.5,-4.24 -8.5,-4.36 -8.546,-4.47 -8.63,-4.554 -8.74,-4.6
  lines w0.1: -8.7,-2.7 -9,-2.7 -9,2.7 -8.7,2.7 ; 8.7,-2.7 9,-2.7 9,2.7 8.7,2.7
  text ".Designator" at -7.7,4.7 h0.7
Top Assembly:
  lines w0.05: -8.89,-2.54 8.89,-2.54 8.89,2.54 -8.89,2.54 -8.89,-2.54
  text "2" at -8.7,2.7 h0.18
  text "14" at 8.5,2.6 h0.18
  text "13" at 8.5,-3.1 h0.18
  text "1" at -8.6,-3.1 h0.18
Top Placement:
  lines w0.01: -9.3,-4.8 9.3,-4.8 9.3,4.7 -9.3,4.7 -9.3,-4.8